# Altium footprint library Footprint-Lib-PhilsLab.PcbLib: 210 footprints (part 4 of 14)
Each footprint in its own frame and in the unit in brackets; x right, y up, seen from the top. Pads: shape width x height; smd on the part's side, far side on the other; paste and mask are expansions set on the pad; w line width, h text height; cw(c..) or ccw(c..) is an arc to the next point about the centre after c.
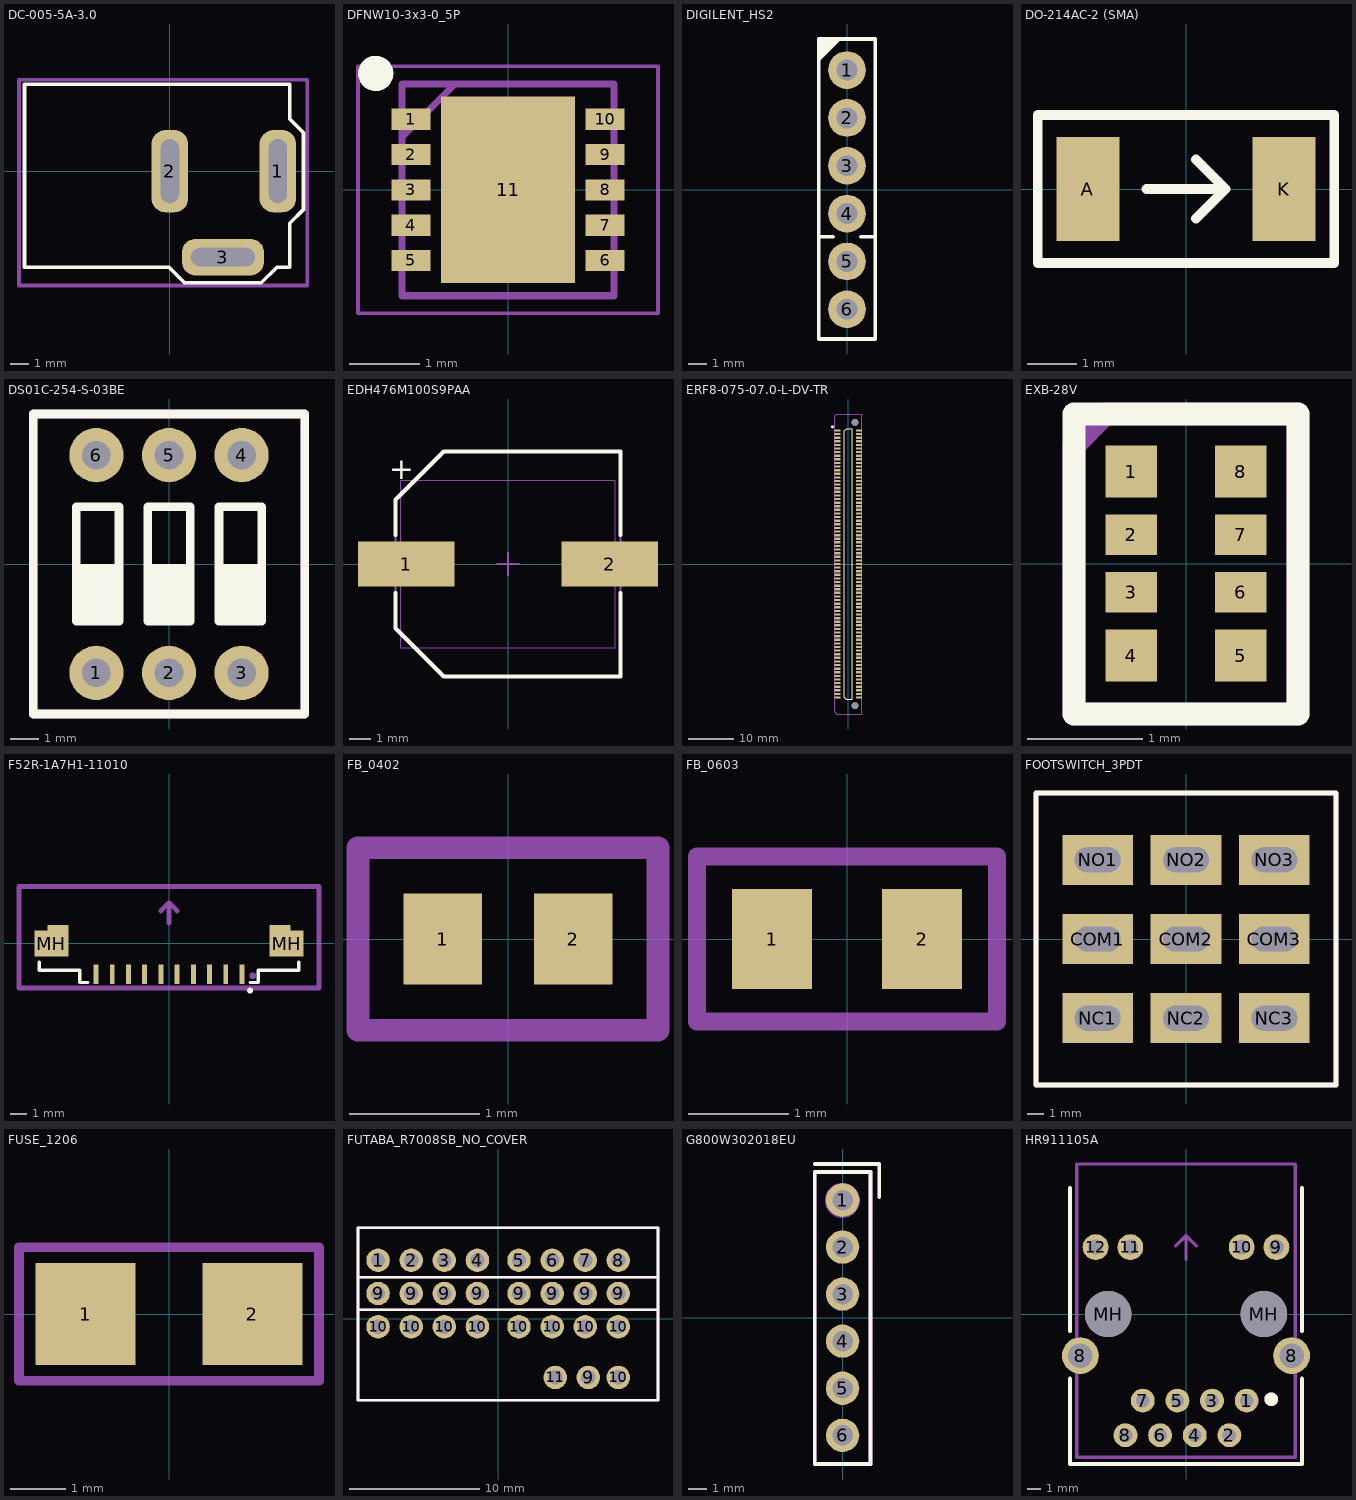
[diagram p3: the footprints below, top view; thin cyan lines are the x and y axes]

## DC-005-5A-3.0 [mm]
pads (3):
  rrect75% 2x4.5 hole 1 slot 3.5 at 90 deg mask+0.07: 1(5.9,0) 2(0,0)
  rrect75% 4.5x2 hole 1 slot 3.5 at 0 deg mask+0.07: 3(2.9,-4.7)
Top Overlay:
  lines w0.2: -7.95,-5.25 -0.05,-5.25 0.8,-6.1 5,-6.1 5.85,-5.25 6.55,-5.25 6.55,-2.85 7.3,-2.1 7.3,2.1 6.55,2.85 6.55,4.75 -7.95,4.75 -7.95,-5.25
Mechanical 13:
  lines w0.2: -8.25,-6.25 -8.25,5 7.5,5 7.5,-6.25 -8.25,-6.25
  text "'.Designator'" at -7.231,-1.087 h1.25
3D body "dc-005-5a-3_0.stp": height 11.01, standoff -3.59, extent -7.7,-4.9 6.3,4.5

## DFNW10-3x3-0_5P [mm]
pads (11):
  rect 0.55x0.3 smd mask+0.15: 1(-1.375,1) 2(-1.375,0.5) 3(-1.375,0) 4(-1.375,-0.5) 5(-1.375,-1) 6(1.375,-1) 7(1.375,-0.5) 8(1.375,0) 9(1.375,0.5) 10(1.375,1)
  rect 1.9x2.64 smd: 11(0,0)
Top Overlay:
  circle w0.25: c-1.875,1.65 r0.125
Mechanical 13:
  lines w0.1: -1.5,0.75 -0.75,1.5 ; -1.5,-1.5 1.5,-1.5 1.5,1.5 -1.5,1.5 -1.5,-1.5
  text "'.Designator'" at -5.815,-0.9 h1
Mechanical 15:
  lines w0.05: -2.125,-1.75 2.125,-1.75 2.125,1.75 -2.125,1.75 -2.125,-1.75
3D body "NCP51200MNTXG.stp": height 1, standoff 0, extent -1.55,-1.5 1.55,1.5

## DIGILENT_HS2 [mm]
pads (6):
  round 2 hole 1.1: 1(0,6.35) 2(0,3.81) 3(0,1.27) 4(0,-1.27) 5(0,-3.81) 6(0,-6.35)
Top Overlay:
  region: -1.5,6.797 -0.297,8 -1.5,8
  lines w0.2: -1.5,-2.5 -0.75,-2.5 ; 0.75,-2.5 1.5,-2.5 ; -1.5,-7.927 1.5,-7.927 1.5,8 -1.5,8 -1.5,-7.927
3D body "68000-x06.stp": height 8.39, standoff -2.4, extent -1.2,-7.62 1.213,7.62

## DO-214AC-2 (SMA) [mm]
pads (2):
  rect 1.27x2.1 smd: A(-1.985,0) K(1.985,0)
Top Overlay:
  lines w0.2: -0.8,0 0.8,0 ; 0.2,-0.6 0.8,0 ; 0.2,0.6 0.8,0 ; 0.8,0 0.8,0 ; -3,-1.5 3,-1.5 3,1.5 -3,1.5 -3,-1.5
Mechanical 13:
  text "'.Designator'" at -5.84,-0.925 h1
3D body "DO-214AC_SMA.step": height 2.42, standoff 0.01, extent -2.6,-1.3 2.6,1.3

## DS01C-254-S-03BE [mm]
pads (6):
  round 1.9 hole 1: 1(-2.54,-3.81) 2(0,-3.81) 3(2.54,-3.81) 4(2.54,3.81) 5(0,3.81) 6(-2.54,3.81)
Top Overlay:
  rectangle: 1.75,-2 3.25,0
  rectangle: -0.75,-2 0.75,0
  rectangle: -3.25,-2 -1.75,0
  lines w0.3: -4.75,-5.25 -4.75,5.25 4.75,5.25 4.75,-5.25 -4.75,-5.25 ; -3.25,-2 -1.75,-2 -1.75,2 -3.25,2 -3.25,-2 ; -0.75,-2 0.75,-2 0.75,2 -0.75,2 -0.75,-2 ; 1.75,-2 3.25,-2 3.25,2 1.75,2 1.75,-2
Mechanical 13:
  lines w0.3: -4.75,-5.25 -4.75,5.25 4.75,5.25 4.75,-5.25 -4.75,-5.25
  text "ON" at -4.083,3.5 h1
  text "'.Designator'" at -5.665,-0.417 h1
3D body "DS01-254-S-03BE.step": height 6.56, standoff -2.99, extent -4.525,-4.95 4.515,4.95

## EDH476M100S9PAA [mm]
height 10.5
pads (2):
  rect 4.5x2.1 smd: 1(-4.75,0) 2(4.75,0)
Top Overlay:
  lines w0.2: -5.25,-1.35 -5.25,-3 -3,-5.25 5.25,-5.25 5.25,-1.35 ; -5.25,1.35 -5.25,3 -3,5.25 5.25,5.25 5.25,1.35
  text "+" at -5.55,3.95 h1
Mechanical 13:
  lines w0.1: -5.25,-3 -5.25,3 -3,5.25 5.25,5.25 5.25,-5.25 -3,-5.25 -5.25,-3
  text "+" at -10.565,3.85 h1
  text "'.Designator'" at -5.815,-0.9 h1
Mechanical 15:
  lines w0.05: -5,-3.9 5,-3.9 5,3.9 -5,3.9 -5,-3.9
  lines w0.1: -0.5,0 0.5,0 ; 0,-0.5 0,0.5
3D body "EDH476M100S9PAA.stp": height 10.52, standoff 0.01, extent -6.1,-5.25 6.1,5.25

## ERF8-075-07.0-L-DV-TR [mm]
pads (152):
  rect 1.4x0.5 smd: 1(-2.4,29.6) 2(2.4,29.6) 3(-2.4,28.8) 4(2.4,28.8) 5(-2.4,28) 6(2.4,28) 7(-2.4,27.2) 8(2.4,27.2) 9(-2.4,26.4) 10(2.4,26.4) 11(-2.4,25.6) 12(2.4,25.6) 13(-2.4,24.8) 14(2.4,24.8) 15(-2.4,24) 16(2.4,24) 17(-2.4,23.2) 18(2.4,23.2) 19(-2.4,22.4) 20(2.4,22.4) 21(-2.4,21.6) 22(2.4,21.6) 23(-2.4,20.8) 24(2.4,20.8) 25(-2.4,20) 26(2.4,20) 27(-2.4,19.2) 28(2.4,19.2) 29(-2.4,18.4) 30(2.4,18.4) 31(-2.4,17.6) 32(2.4,17.6) 33(-2.4,16.8) 34(2.4,16.8) 35(-2.4,16) 36(2.4,16) 37(-2.4,15.2) 38(2.4,15.2) 39(-2.4,14.4) 40(2.4,14.4) 41(-2.4,13.6) 42(2.4,13.6) 43(-2.4,12.8) 44(2.4,12.8) 45(-2.4,12) 46(2.4,12) 47(-2.4,11.2) 48(2.4,11.2) 49(-2.4,10.4) 50(2.4,10.4) 51(-2.4,9.6) 52(2.4,9.6) 53(-2.4,8.8) 54(2.4,8.8) 55(-2.4,8) 56(2.4,8) 57(-2.4,7.2) 58(2.4,7.2) 59(-2.4,6.4) 60(2.4,6.4) 61(-2.4,5.6) 62(2.4,5.6) 63(-2.4,4.8) 64(2.4,4.8) 65(-2.4,4) 66(2.4,4) 67(-2.4,3.2) 68(2.4,3.2) 69(-2.4,2.4) 70(2.4,2.4) 71(-2.4,1.6) 72(2.4,1.6) 73(-2.4,0.8) 74(2.4,0.8) 75(-2.4,0) 76(2.4,0) 77(-2.4,-0.8) 78(2.4,-0.8) 79(-2.4,-1.6) 80(2.4,-1.6) 81(-2.4,-2.4) 82(2.4,-2.4) 83(-2.4,-3.2) 84(2.4,-3.2) 85(-2.4,-4) 86(2.4,-4) 87(-2.4,-4.8) 88(2.4,-4.8) 89(-2.4,-5.6) 90(2.4,-5.6) 91(-2.4,-6.4) 92(2.4,-6.4) 93(-2.4,-7.2) 94(2.4,-7.2) 95(-2.4,-8) 96(2.4,-8) 97(-2.4,-8.8) 98(2.4,-8.8) 99(-2.4,-9.6) 100(2.4,-9.6) 101(-2.4,-10.4) 102(2.4,-10.4) 103(-2.4,-11.2) 104(2.4,-11.2) 105(-2.4,-12) 106(2.4,-12) 107(-2.4,-12.8) 108(2.4,-12.8) 109(-2.4,-13.6) 110(2.4,-13.6) 111(-2.4,-14.4) 112(2.4,-14.4) 113(-2.4,-15.2) 114(2.4,-15.2) 115(-2.4,-16) 116(2.4,-16) 117(-2.4,-16.8) 118(2.4,-16.8) 119(-2.4,-17.6) 120(2.4,-17.6) 121(-2.4,-18.4) 122(2.4,-18.4) 123(-2.4,-19.2) 124(2.4,-19.2) 125(-2.4,-20) 126(2.4,-20) 127(-2.4,-20.8) 128(2.4,-20.8) 129(-2.4,-21.6) 130(2.4,-21.6) 131(-2.4,-22.4) 132(2.4,-22.4) 133(-2.4,-23.2) 134(2.4,-23.2) 135(-2.4,-24) 136(2.4,-24) 137(-2.4,-24.8) 138(2.4,-24.8) 139(-2.4,-25.6) 140(2.4,-25.6) 141(-2.4,-26.4) 142(2.4,-26.4) 143(-2.4,-27.2) 144(2.4,-27.2) 145(-2.4,-28) 146(2.4,-28) 147(-2.4,-28.8) 148(2.4,-28.8) 149(-2.4,-29.6) 150(2.4,-29.6)
  round 1.5 hole 1.5 unplated: MH(1.5,-31.4) MH(1.5,31.4)
Top Overlay:
  circle w0.3: c-3.498,30.405 r0.15
  lines w0.2: -0.865,-29.535 -0.4,-30 0.865,-30 0.865,30 -0.365,30 -0.865,29.5 -0.865,-29.535
Mechanical 13:
  circle w0.3: c-3.496,30.405 r0.15
  lines w0.25: -3,-32.75 -2.5,-33.25 3,-33.25 3,33.25 -2.5,33.25 -3,32.75 -3,-32.75
  text "'.Designator'" at -5.815,-0.9 h1
3D body "ERF8-075-07.0-L-DV-TR.stp": height 7.28, standoff -1.01, extent -2.8,-33 2.8,33

## EXB-28V [mm]
pads (8):
  rect 0.45x0.45 smd mask+0.05: 1(-0.475,0.8) 4(-0.475,-0.8) 5(0.475,-0.8) 8(0.475,0.8)
  rect 0.45x0.35 smd mask+0.05: 2(-0.475,0.25) 3(-0.475,-0.25) 6(0.475,-0.25) 7(0.475,0.25)
Top Overlay:
  lines w0.2: -0.975,-1.308 -0.975,1.3 0.975,1.3 0.975,-1.308 -0.975,-1.308
Mechanical 13:
  lines w0.2: -0.975,-1.308 -0.975,1.025 -0.7,1.3 0.975,1.3 0.975,-1.308 -0.975,-1.308
  text "'.Designator'" at -5.665,-0.417 h1
3D body "R-Array-0402.step": height 0.45, standoff 0, extent -0.5,-1 0.5,1

## F52R-1A7H1-11010 [mm]
pads (14):
  rect 0.3x1.2 smd: 1(4.5,-1.913) 2(3.5,-1.913) 3(2.5,-1.913) 4(1.5,-1.913) 5(0.5,-1.913) 6(-0.5,-1.913) 7(-1.5,-1.913) 8(-2.5,-1.913) 9(-3.5,-1.913) 10(-4.5,-1.913)
  rect 2.1x1.6 smd: MH(-7.25,-0.013) MH(7.25,-0.013)
  rect 1.3x0.35 smd: MH(-6.85,0.962) MH(6.85,0.962)
Top Overlay:
  circle w0.254: c5,-2.913 r0.05
  lines w0.2: -8,-1.162 -8,-1.663 -5.5,-1.663 -5.5,-2.412 -5,-2.412 ; 5,-2.412 5.5,-2.412 5.5,-1.663 8,-1.663 8,-1.162
Mechanical 13:
  circle w0.254: c5.159,-2 r0.079
  lines w0.3: -0.5,2 0,2.5 ; 0,1.25 0,2.5 ; 0.5,2 0,2.5 ; -9.25,-2.75 -9.25,3.5 9.25,3.5 9.25,-2.75 -8.75,-2.75 -9.25,-2.75
  text "'.Designator'" at -5.665,-0.417 h1
3D body "f52r_10pin_asm.stp": height 2.06, standoff 0.01, extent -8.9,-2.412 8.9,3.088

## FB_0402 [mm]
pads (2):
  rect 0.6x0.7 smd: 1(-0.5,0) 2(0.5,0)
Mechanical 13:
  lines w0.175: -1.15,-0.7 -1.15,0.7 1.15,0.7 1.15,-0.7 -1.15,-0.7
  text "'.Designator'" at -5.665,-0.417 h1
3D body "FB0402.stp": height 0.51, standoff 0.01, extent -0.5,-0.25 0.5,0.25

## FB_0603 [mm]
pads (2):
  rect 0.8x1 smd: 1(-0.75,0) 2(0.75,0)
Mechanical 13:
  lines w0.175: -1.5,-0.825 -1.5,0.825 1.5,0.825 1.5,-0.825 -1.5,-0.825
  text "'.Designator'" at -5.665,-0.417 h1
3D body "FB-0603.STEP": height 0.81, standoff 0.01, extent -0.8,-0.4 0.8,0.4

## FOOTSWITCH_3PDT [mm]
pads (9):
  rect 4.25x3 hole 1.5 slot 2.75 at 0 deg: COM1(-5.3,0) COM2(0,0) COM3(5.3,0) NC1(-5.3,-4.75) NC2(0,-4.75) NC3(5.3,-4.75) NO1(-5.3,4.75) NO2(0,4.75) NO3(5.3,4.75)
Top Overlay:
  lines w0.3: -9,-8.75 -9,8.75 -6.5,8.75 9,8.75 9,-8.75 -9,-8.75
Mechanical 13:
  lines w0.3: -9,-8.75 -9,8.75 9,8.75 9,-8.75 -9,-8.75
  text "'.Designator'" at -5.665,-0.417 h1
3D body "3PDT_Footswitch_NoNutNoWasher.step": height 37.96, standoff -4.14, extent -9.8,-8.5 9.8,8.5

## FUSE_1206 [mm]
pads (2):
  rect 1.8x1.84 smd: 1(-1.5,0) 2(1.5,0)
Mechanical 13:
  lines w0.175: -2.7,-1.2 -2.7,1.2 2.7,1.2 2.7,-1.2 -2.7,-1.2
  text "'.Designator'" at -5.665,-0.417 h1
3D body "Fuse_1206.stp": height 0.84, standoff 0.01, extent -1.652,-0.815 1.652,0.815

## FUTABA_R7008SB_NO_COVER [mm]
pads (27):
  round 1.8 hole 1.1: 1(-9.212,4.487) 2(-6.672,4.487) 3(-4.132,4.487) 4(-1.592,4.487) 5(1.593,4.487) 6(4.133,4.487) 7(6.673,4.487) 8(9.213,4.487) 9(-9.212,1.947) 9(-6.672,1.947) 9(-4.132,1.947) 9(-1.592,1.947) 9(1.593,1.947) 9(4.133,1.947) 9(6.673,1.947) 9(6.913,-4.487) 9(9.213,1.947) 10(-9.212,-0.593) 10(-6.672,-0.593) 10(-4.132,-0.593) 10(-1.592,-0.593) 10(1.593,-0.593) 10(4.133,-0.593) 10(6.673,-0.593) 10(9.213,-4.487) 10(9.213,-0.593) 11(4.373,-4.487)
Top Overlay:
  lines w0.2: -10.75,0.7 12.25,0.7 ; -10.75,3.2 12.25,3.2 ; -10.75,-6.25 -10.75,7 12.25,7 12.25,-6.25 -10.75,-6.25
Mechanical 13:
  lines w0.2: -10.75,0.7 12.25,0.7 ; -10.75,3.2 12.25,3.2 ; -10.75,-6.25 -10.75,7 12.25,7 12.25,-6.25 -10.75,-6.25
  text "'.Designator'" at -5.665,-0.417 h1
3D body "FUTABA_R7008SB_NO_COVER.STEP": height 39.51, standoff -5.99, extent -10.45,-5.94 11.95,6.76

## G800W302018EU [mm]
pads (6):
  round 1.8 hole 1.1 mask+0.07: 1(0,6.35) 2(0,3.81) 3(0,1.27) 4(0,-1.27) 5(0,-3.81) 6(0,-6.35)
Top Overlay:
  lines w0.2: -1.5,8.3 1.972,8.3 1.972,6.5 ; -1.5,-7.9 1.5,-7.9 1.5,7.863 -1.5,7.863 -1.5,-7.9
Mechanical 13:
  circle w0.25: c-0.012,6.336 r0.823
  lines w0.2: -1.5,-7.9 1.5,-7.9 1.5,7.864 -1.5,7.864 -1.5,-7.9
  text "'.Designator'" at -5.84,-0.925 h1
3D body "g800w302xxxeu.stp": height 8.61, standoff -2.99, extent -1.25,-7.62 1.25,7.62

## HR911105A [mm]
pads (16):
  round 1.75 hole 1: 1(4.45,-6.35) 2(3.18,-8.89) 3(1.91,-6.35) 4(0.64,-8.89) 5(-0.63,-6.35) 6(-1.9,-8.89) 7(-3.17,-6.35) 8(-4.44,-8.89)
  round 2.7 hole 1.8: 8(-7.745,-3.05) 8(7.745,-3.05)
  round 1.9 hole 1.1: 9(6.625,4.9) 10(4.085,4.9) 11(-4.085,4.9) 12(-6.625,4.9)
  round 3.4 hole 3.4 unplated: MH(-5.715,0) MH(5.715,0)
Top Overlay:
  circle w0.5: c6.25,-6.25 r0.25
  lines w0.3: -8.5,-4.75 -8.5,-11 8.5,-11 8.5,-4.75 ; -8.5,-1.25 -8.5,9.25 ; 8.5,-1.25 8.5,9.25
Mechanical 13:
  circle w0.5: c6.25,-6.25 r0.25
  lines w0.254: -0.75,5 0,5.75 ; 0,4 0,5.75 ; 0.75,5 0,5.75 ; -8,-10.5 -8,11 8,11 8,-10.5 -8,-10.5
  text "'.Designator'" at -5.665,-0.417 h1
3D body "HR911105A.step": height 13.51, standoff -2.99, extent -7.93,-10.48 7.95,10.92